# Altium footprint library SYB.PcbLib.PcbLib: 89 footprints (part 6 of 6)
Each footprint in its own frame and in the unit in brackets; x right, y up, seen from the top. Pads: shape width x height; smd on the part's side, far side on the other; paste and mask are expansions set on the pad; w line width, h text height; cw(c..) or ccw(c..) is an arc to the next point about the centre after c.
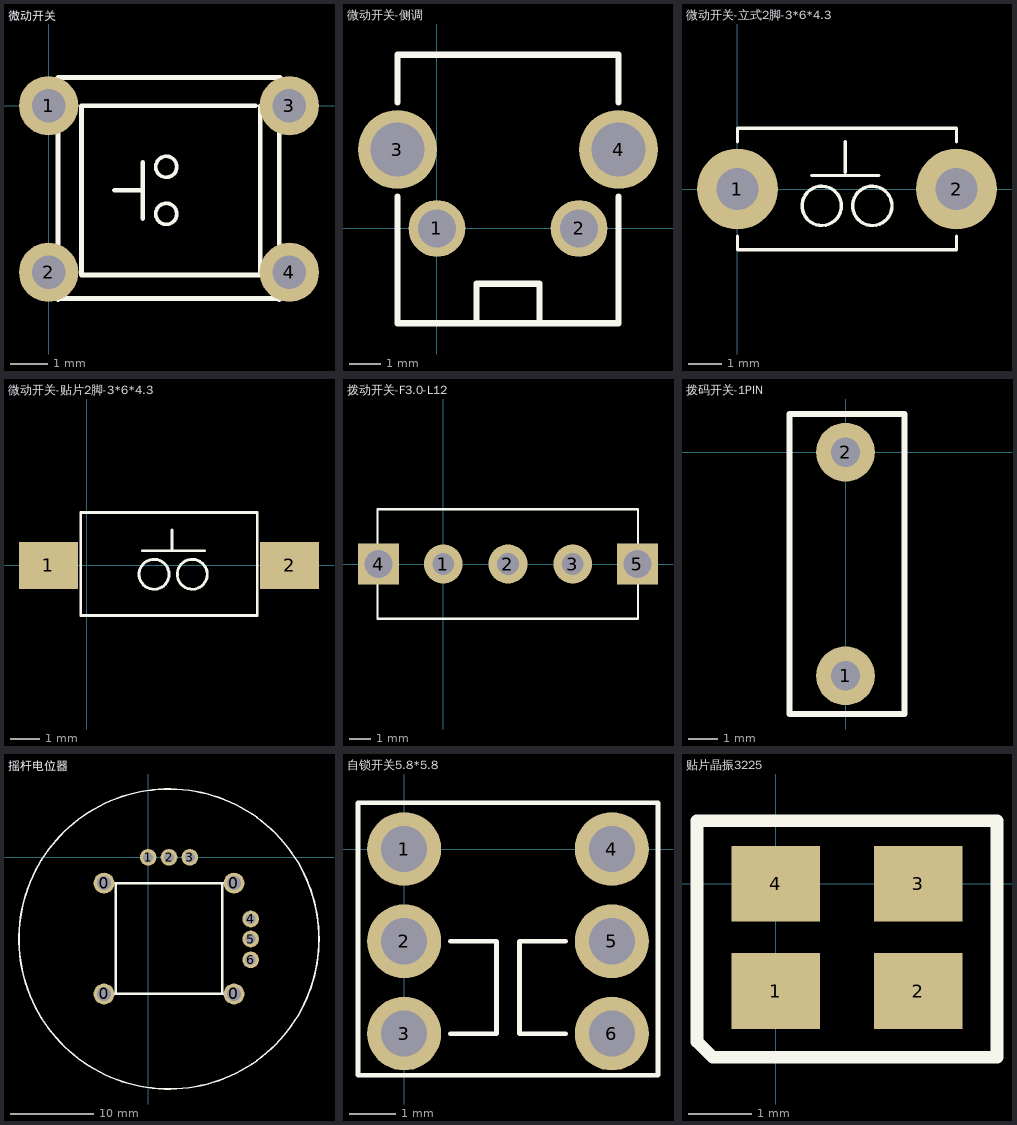
[diagram p5: the footprints below, top view; thin cyan lines are the x and y axes]

## 微动开关 [mm] "6*6*5MM微动开关"
pads (4):
  round 1.6 hole 0.9: 1(0,0) 2(0,-4.5) 3(6.5,0) 4(6.5,-4.5)
Top Overlay:
  circle w0.1: c3.175,-2.921 r0.284
  circle w0.1: c3.175,-1.651 r0.284
  lines w0.127: 0.254,-5.238 0.254,0.762 6.254,0.762 ; 0.254,-5.207 6.254,-5.207 ; 1.778,-2.286 2.54,-2.286 ; 2.54,-3.048 2.54,-1.524 ; 5.588,0 0.889,0 0.889,-4.572 5.715,-4.572 5.715,0 ; 6.223,-5.238 6.223,0.762
3D body: height 4.5, standoff 2, extent 1.753,-3.912 4.741,-0.918
3D body: height 2, standoff 0, extent 0.191,-5.302 6.318,0.826

## 微动开关-侧调 [mm]
pads (4):
  round 1.8 hole 1.2: 1(0,0) 2(4.5,0)
  round 2.5 hole 1.7: 3(-1.25,2.5) 4(5.75,2.5)
Top Overlay:
  lines w0.2: -1.25,1 -1.25,-3 5.75,-3 5.75,1 ; -1.25,4 -1.25,5.5 5.75,5.5 5.75,4 ; 1.25,-3 1.25,-1.75 3.25,-1.75 3.25,-3

## 微动开关-立式2脚-3*6*4.3 [mm]
pads (2):
  round 2.4 hole 1.25: 1(0,0) 2(6.5,0)
Top Overlay:
  circle w0.1: c2.5,-0.5 r0.583
  circle w0.1: c4,-0.5 r0.583
  lines w0.1: 0,-1.4 0,-1.7 0,-1.8 6.5,-1.8 6.5,-1.4 ; 0,1.4 0,1.8 6.5,1.8 6.5,1.4 ; 2.2,0.4 4.2,0.4 ; 3.2,0.5 3.2,1.4

## 微动开关-贴片2脚-3*6*4.3 [mm]
pads (2):
  rect 2x1.6 smd: 1(-1.3,0) 2(6.9,0)
Top Overlay:
  circle w0.1: c2.29,-0.3 r0.51
  circle w0.1: c3.59,-0.3 r0.51
  lines w0.1: 1.9,0.5 4,0.5 ; 2.9,0.5 2.9,1.2 ; -0.2,-1.7 -0.2,1.8 5.8,1.8 5.8,-1.7 -0.2,-1.7

## 拨动开关-F3.0-L12 [mm] "间距3MM-三脚2挡-带支架"
height 8
pads (5):
  round 1.8 hole 1: 1(0,0) 2(3,0) 3(6,0)
  rect 1.9x1.9 hole 1.3: 4(-3,0) 5(9,0)
Top Overlay:
  lines w0.1: -3.048,-0.127 -3.048,-2.54 9.017,-2.54 ; -3.048,0 -3.048,2.5 ; -3.048,2.54 9.017,2.54 ; 9.017,-2.5 9.017,0 9.017,2.5
3D body: height 3, standoff 0, extent -3.073,-2.54 9.042,2.54
3D body: height 3, standoff 0, extent -0.025,-1.702 5.994,1.778
3D body: height 8, standoff 0, extent -0.025,-1.702 3.048,1.778

## 拨码开关-1PIN [mm]
pads (2):
  round 2 hole 1: 1(0,-7.6) 2(0,0)
Top Overlay:
  lines w0.2: -1.9,-8.9 2,-8.9 2,1.3 -1.9,1.3 -1.9,-8.9

## 摇杆电位器 [mm]
pads (10):
  round 2.5 hole 1.7: 0(-5.3,-16.4) 0(-5.3,-3.1) 0(10.3,-16.4) 0(10.3,-3.1)
  round 2 hole 1.2: 1(0,0) 2(2.5,0) 3(5,0) 4(12.3,-7.4) 5(12.3,-9.8) 6(12.3,-12.3)
Top Overlay:
  circle w0.2: c2.5,-9.8 r18
  lines w0.3: -5.55,-16.4 2.2,-16.4 9.95,-16.4 ; -5.25,-3.1 2.5,-3.1 10.25,-3.1 ; -3.9,-16.4 -3.9,-3.1 ; 8.9,-16.4 8.9,-3.1 ; 12.3,-9.75 12.4,-9.65

## 自锁开关5.8*5.8 [mm]
pads (6):
  round 1.6 hole 1: 1(0,0) 2(0,-2) 3(0,-4) 4(4.5,0) 5(4.5,-2) 6(4.5,-4)
Top Overlay:
  lines w0.1: 1,-4 2,-4 2,-2 1,-2 ; 3.5,-4 2.5,-4 2.5,-2 3.5,-2 ; -1,-4.9 -1,1 5.5,1 5.5,-4.9 -1,-4.9

## 贴片晶振3225 [mm]
pads (4):
  rect 1.4x1.2 smd: 1(0,-1.7) 2(2.25,-1.7) 3(2.25,0) 4(0,0)
Top Overlay:
  lines w0.2: -1.25,-2.5 -1.25,1 3.5,1 3.5,-2.75 -1,-2.75 -1.25,-2.5